# Altium footprint library Supernova Connectors.PcbLib: 303 footprints (part 19 of 19)
Each footprint in its own frame and in the unit in brackets; x right, y up, seen from the top. Pads: shape width x height; smd on the part's side, far side on the other; paste and mask are expansions set on the pad; w line width, h text height; cw(c..) or ccw(c..) is an arc to the next point about the centre after c.
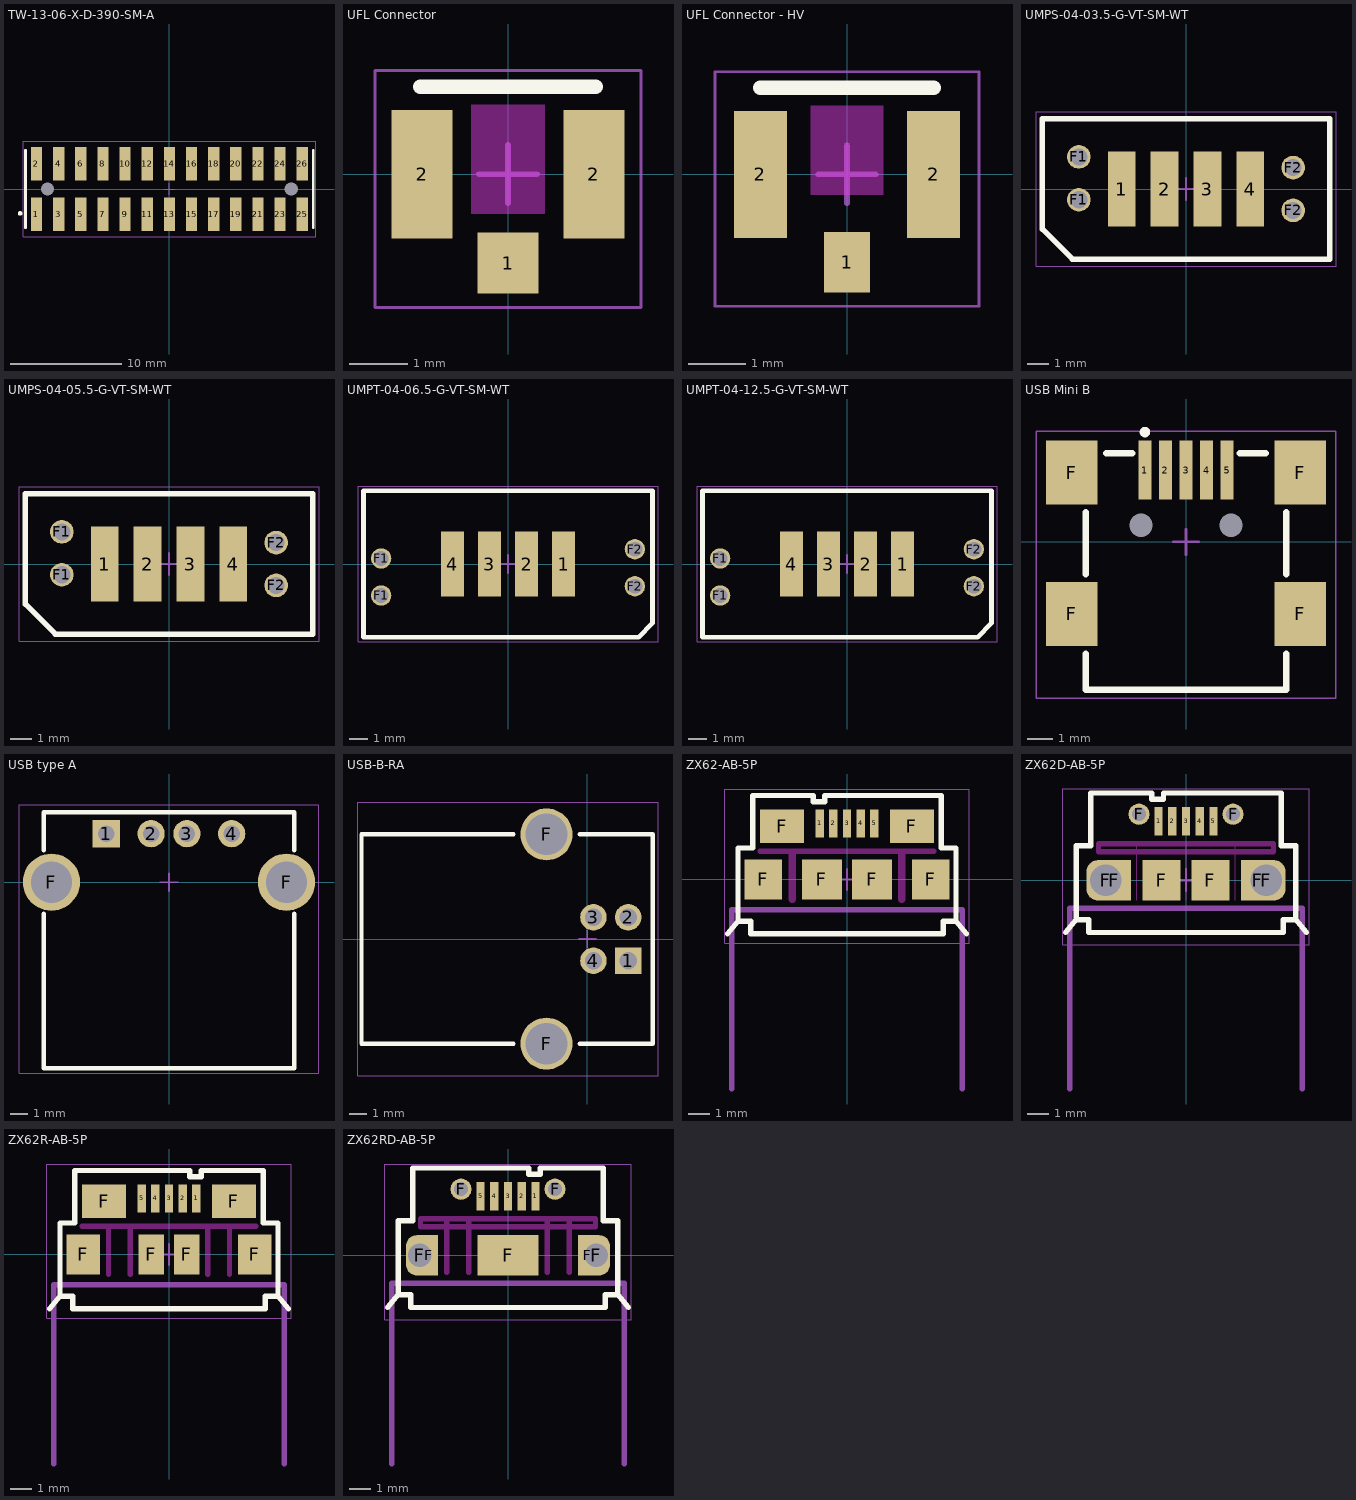
[diagram p18: the footprints below, top view; thin cyan lines are the x and y axes]

## TW-13-06-X-D-390-SM-A [mil]
pads (28):
  rect 40x119 smd mask+2: 1(-472.44,-89.5) 2(-472.44,89.5) 3(-393.7,-89.5) 4(-393.7,89.5) 5(-314.96,-89.5) 6(-314.96,89.5) 7(-236.22,-89.5) 8(-236.22,89.5) 9(-157.48,-89.5) 10(-157.48,89.5) 11(-78.74,-89.5) 12(-78.74,89.5) 13(0,-89.5) 14(0,89.5) 15(78.74,-89.5) 16(78.74,89.5) 17(157.48,-89.5) 18(157.48,89.5) 19(236.22,-89.5) 20(236.22,89.5) 21(314.96,-89.5) 22(314.96,89.5) 23(393.7,-89.5) 24(393.7,89.5) 25(472.44,-89.5) 26(472.44,89.5)
  round 0 hole 46.85 unplated: ""(-433.07,0) ""(433.07,0)
Top Overlay:
  circle w8: c-530.63,-86.61 r4
  lines w10: -511.81,-137.8 -511.81,137.8 ; 511.81,-137.8 511.81,137.8
Top Courtyard:
  lines w1.97: -520,-170 -520,170 520,170 520,-170 -520,-170
  lines w3.94: -19.68,0 19.68,0 ; 0,-19.68 0,19.69
3D body "TW-13-06-L-D-390-SM-A.stp": height 605, standoff -50, extent -511.8,-132.49 511.82,132.51

## UFL Connector [mm]
pads (3):
  rect 1.05x1.05 smd: 1(0,-1.525)
  rect 1.05x2.2 smd paste-0.1: 2(-1.475,0) 2(1.475,0)
Top Layer keep-out:
  rectangle: -0.635,-0.686 0.635,1.194
Top Overlay:
  lines w0.254: -1.5,1.5 1.5,1.5
Top Courtyard:
  lines w0.05: -2.286,-2.286 2.286,-2.286 2.286,1.778 -2.286,1.778 -2.286,-2.286
  lines w0.1: -0.5,0 0.5,0 ; 0,-0.5 0,0.5
3D body "U.FL-R-SMT.stp": height 1.25, standoff 0, extent -1.5,-1.525 1.5,1.575

## UFL Connector - HV [mm]
pads (3):
  rect 0.8x1.05 smd: 1(0,-1.525)
  rect 0.914x2.2 smd paste-0.1: 2(-1.5,0) 2(1.5,0)
Top Layer keep-out:
  rectangle: -0.635,-0.356 0.635,1.194
Top Overlay:
  lines w0.254: -1.5,1.5 1.5,1.5
Top Courtyard:
  lines w0.05: -2.286,-2.286 -2.286,1.778 2.286,1.778 2.286,-2.286 -2.286,-2.286
  lines w0.1: -0.5,0 0.5,0 ; 0,-0.5 0,0.5
3D body "U.FL-R-SMT.stp": height 1.25, standoff 0, extent -1.5,-1.525 1.5,1.575

## UMPS-04-03.5-G-VT-SM-WT [mm]
pads (8):
  rect 1.3x3.5 smd: 1(-3,0) 2(-1,0) 3(1,0) 4(3,0)
  round 1.1 hole 0.8: F1(-5,-0.5) F1(-5,1.5) F2(5,-1) F2(5,1)
Top Overlay:
  lines w0.254: -6.7,-1.875 -6.7,3.275 6.7,3.275 6.7,-3.275 -5.3,-3.275 -6.7,-1.875
Top Paste:
  region: 6.85,-0.2 4.4,-0.2 4.4,-2.48 6.85,-2.48
  region: 6.85,2.48 4.4,2.48 4.4,0.2 6.85,0.2
  rectangle: -6.85,-1.98 -4.4,0.3
  rectangle: -6.85,0.7 -4.4,2.98
Top Courtyard:
  lines w0.05: -7,-3.6 7,-3.6 7,3.6 -7,3.6 -7,-3.6
  lines w0.1: -0.5,0 0.5,0 ; 0,-0.5 0,0.5
3D body "UMPS-04-03.5-G-VT-SM-WT.stp": height 4.18, standoff -1.42, extent -6.525,-3.1 6.525,3.1

## UMPS-04-05.5-G-VT-SM-WT [mm]
pads (8):
  rect 1.3x3.5 smd: 1(-3,0) 2(-1,0) 3(1,0) 4(3,0)
  round 1.1 hole 0.8: F1(-5,-0.5) F1(-5,1.5) F2(5,-1) F2(5,1)
Top Overlay:
  lines w0.254: -6.7,-1.875 -5.3,-3.275 6.7,-3.275 6.7,3.275 -6.7,3.275 -6.7,-1.875
Top Paste:
  rectangle: -6.85,0.7 -4.4,2.98
  rectangle: -6.85,-1.98 -4.4,0.3
  region: 6.85,2.48 4.4,2.48 4.4,0.2 6.85,0.2
  region: 6.85,-0.2 4.4,-0.2 4.4,-2.48 6.85,-2.48
Top Courtyard:
  lines w0.05: -7,-3.6 -7,3.6 7,3.6 7,-3.6 -7,-3.6
  lines w0.1: -0.5,0 0.5,0 ; 0,-0.5 0,0.5
3D body "UMPS-04-05.5-G-VT-SM-WT.stp": height 6.18, standoff -1.42, extent -6.525,-3.1 6.525,3.1

## UMPT-04-06.5-G-VT-SM-WT [mm]
pads (8):
  rect 1.25x3.5 smd: 1(3,0) 2(1,0) 3(-1,0) 4(-3,0)
  round 1.1 hole 0.8: F1(-6.85,-1.7) F1(-6.85,0.3) F2(6.85,-1.2) F2(6.85,0.8)
Top Overlay:
  lines w0.254: -7.8,-3.95 7.05,-3.95 7.8,-3.2 7.8,3.95 -7.8,3.95 -7.8,-3.95
Top Paste:
  rectangle: -8.075,-3.18 -5.625,-0.9
  rectangle: -8.075,-0.5 -5.625,1.78
  rectangle: 5.625,-2.68 8.075,-0.4
  rectangle: 5.625,0 8.075,2.28
Top Courtyard:
  lines w0.05: -8.1,-4.2 -8.1,4.2 8.1,4.2 8.1,-4.2 -8.1,-4.2
  lines w0.1: -0.5,0 0.5,0 ; 0,-0.5 0,0.5
3D body "UMPT-04-06.5-G-VT-SM-WT.stp": height 9.58, standoff -1.37, extent -7.65,-3.8 7.65,3.8

## UMPT-04-12.5-G-VT-SM-WT [mm]
pads (8):
  rect 1.25x3.5 smd: 1(3,0) 2(1,0) 3(-1,0) 4(-3,0)
  round 1.1 hole 0.8: F1(-6.85,-1.7) F1(-6.85,0.3) F2(6.85,-1.2) F2(6.85,0.8)
Top Overlay:
  lines w0.254: -7.8,-3.95 -7.8,3.95 7.8,3.95 7.8,-3.2 7.05,-3.95 -7.8,-3.95
Top Paste:
  rectangle: 5.625,0 8.075,2.28
  rectangle: 5.625,-2.68 8.075,-0.4
  rectangle: -8.075,-0.5 -5.625,1.78
  rectangle: -8.075,-3.18 -5.625,-0.9
Top Courtyard:
  lines w0.05: -8.1,-4.2 8.1,-4.2 8.1,4.2 -8.1,4.2 -8.1,-4.2
  lines w0.1: -0.5,0 0.5,0 ; 0,-0.5 0,0.5
3D body "UMPT-04-12.5-G-VT-SM-WT.stp": height 15.82, standoff -1.37, extent -7.65,-3.8 7.65,3.8

## USB Mini B [mm]
pads (11):
  rect 0.5x2.3 smd mask+0.051: 1(-1.6,2.8) 2(-0.8,2.8) 3(0,2.8) 4(0.8,2.8) 5(1.6,2.8)
  rect 2x2.5 smd paste-0.15: F(-4.45,-2.8) F(-4.45,2.7) F(4.45,-2.8) F(4.45,2.7)
  round 0.5 hole 0.9 unplated: ""(-1.75,0.65) ""(1.75,0.65)
Top Overlay:
  circle w0.203: c-1.6,4.278 r0.102
  lines w0.254: -3.9,-4.35 -3.9,-5.75 3.9,-5.75 3.9,-4.35 ; -3.9,-1.25 -3.9,1.15 ; -3.1,3.45 -2.1,3.45 ; 2.1,3.45 3.1,3.45 ; 3.9,-1.25 3.9,1.15
Top Courtyard:
  lines w0.05: -5.842,-6.096 5.842,-6.096 5.842,4.318 -5.842,4.318 -5.842,-6.096
  lines w0.1: -0.5,0 0.5,0 ; 0,-0.5 0,0.5
3D body "c-1734035-1-e-3d.STEP": height 4.14, standoff -0.95, extent -4.95,-5.75 4.95,3.45

## USB type A [mm]
pads (6):
  rect 1.524x1.524 hole 0.92: 1(-3.5,2.71)
  round 1.524 hole 0.92: 2(-1,2.71) 3(1,2.71) 4(3.5,2.71)
  round 3.2 hole 2.3: F(-6.57,0) F(6.57,0)
Top Overlay:
  lines w0.254: -7,-1.775 -7,-10.4 7,-10.4 7,-1.775 ; -7,1.775 -7,3.9 7,3.9 7,1.775
Top Courtyard:
  lines w0.05: -8.382,-10.668 -8.382,4.318 8.382,4.318 8.382,-10.668 -8.382,-10.668
  lines w0.1: -0.5,0 0.5,0 ; 0,-0.5 0,0.5
3D body "1001-001-01000.STEP": height 7.65, standoff -3.77, extent -7.849,-10.338 7.848,3.812

## USB-B-RA [mm]
pads (6):
  rect 1.524x1.524 hole 1: 1(2.35,-1.25)
  round 1.524 hole 1: 2(2.35,1.25) 3(0.35,1.25) 4(0.35,-1.25)
  round 3 hole 2.4: F(-2.35,-6.02) F(-2.35,6.02)
Top Overlay:
  lines w0.254: -4.25,-6.02 -13,-6.02 -13,6.02 -4.25,6.02 ; -0.45,-6.02 3.75,-6.02 3.75,6.02 -0.45,6.02
Top Courtyard:
  lines w0.05: -13.2,-7.874 4.064,-7.874 4.064,7.874 -13.2,7.874 -13.2,-7.874
  lines w0.1: -0.5,0 0.5,0 ; 0,-0.5 0,0.5
3D body "lumberg_2411_03.stp": height 10.98, standoff -3.61, extent -12.8,-7.499 3.9,7.499

## V2016B [mm]
3D body "v2016b.stp": height 9, standoff 2, extent -4.25,-4.25 4.25,4.25

## ZX62-AB-5P [mm]
pads (11):
  rect 0.4x1.35 smd: 1(-1.3,2.675) 2(-0.65,2.675) 3(0,2.675) 4(0.65,2.675) 5(1.3,2.675)
  rect 1.8x1.9 smd paste-0.15: F(-4,0) F(4,0)
  rect 2.1x1.6 smd paste-0.15: F(-3.1,2.55) F(3.1,2.55)
  rect 1.9x1.9 smd paste-0.15: F(-1.2,0) F(1.2,0)
Top Layer keep-out:
  lines w0.254: -4.14,1.347 4.14,1.347
  lines w0.356: -2.616,-0.94 -2.616,1.27 ; 2.616,-0.94 2.616,1.27
Top Overlay:
  lines w0.254: -5.7,-2.595 -5.2,-1.995 ; -1.626,4.005 -4.5,4.005 -4.5,1.505 -5.2,1.505 -5.2,-1.295 -5.2,-1.995 ; -1.616,4.005 -1.616,3.705 -1.066,3.705 -1.066,4.005 ; -1.041,4.005 4.5,4.005 4.5,1.505 5.2,1.505 5.2,-1.295 5.2,-1.995 ; 5.7,-2.595 5.2,-1.995 ; -5.2,-1.995 -4.6,-1.995 -4.6,-2.595 4.6,-2.595 4.6,-1.995 5.2,-1.995
Mechanical 5:
  lines w0.254: -5.5,-10 -5.5,-1.45 5.5,-1.45 5.5,-10
Top Courtyard:
  lines w0.05: -5.842,-3.048 5.842,-3.048 5.842,4.318 -5.842,4.318 -5.842,-3.048
  lines w0.1: -0.5,0 0.5,0 ; 0,-0.5 0,0.5
3D body "ZX62-AB-5PA.stp": height 2.76, standoff -0.19, extent -4.4,-2.773 4.4,2.827

## ZX62D-AB-5P [mm]
pads (13):
  rect 0.4x1.35 smd: 1(-1.3,2.8) 2(-0.65,2.8) 3(0,2.8) 4(0.65,2.8) 5(1.3,2.8)
  rrect56% 1.8x1.9 hole 1.5: F(-3.8,0) F(3.8,0)
  rect 1.575x1.9 smd: F(-3.387,0) F(3.387,0)
  round 1 hole 0.66: F(-2.225,3.125) F(2.225,3.125)
  rect 1.8x1.9 smd paste-0.15: F(-1.15,0) F(1.15,0)
Top Layer keep-out:
  lines w0.051: -2.325,-0.95 -2.325,1.722 ; 0,-0.95 0,1.722 ; 2.325,-0.95 2.325,1.722
  lines w0.254: -4.14,1.35 -4.14,1.722 4.14,1.722 4.14,1.35 -4.14,1.35
Top Overlay:
  lines w0.254: -5.7,-2.47 -5.2,-1.87 ; -1.626,4.13 -4.5,4.13 -4.5,1.63 -5.2,1.63 -5.2,-1.17 -5.2,-1.87 ; -1.616,4.13 -1.616,3.83 -1.066,3.83 -1.066,4.13 ; -1.041,4.13 4.5,4.13 4.5,1.63 5.2,1.63 5.2,-1.17 5.2,-1.87 ; 5.7,-2.47 5.2,-1.87 ; -5.2,-1.87 -4.6,-1.87 -4.6,-2.47 4.6,-2.47 4.6,-1.87 5.2,-1.87
Mechanical 5:
  lines w0.254: -5.5,-9.875 -5.5,-1.325 5.5,-1.325 5.5,-9.875
Top Courtyard:
  lines w0.05: -5.842,-3.048 -5.842,4.318 5.842,4.318 5.842,-3.048 -5.842,-3.048
  lines w0.1: -0.5,0 0.5,0 ; 0,-0.5 0,0.5
3D body "ZX62D-AB-5P8.stp": height 2.79, standoff -0.6, extent -4.325,-2.624 4.325,3.274

## ZX62R-AB-5P [mm]
pads (11):
  rect 0.4x1.35 smd: 1(1.3,2.675) 2(0.65,2.675) 3(0,2.675) 4(-0.65,2.675) 5(-1.3,2.675)
  rect 1.6x1.9 smd paste-0.15: F(-4.1,0) F(4.1,0)
  rect 2.1x1.6 smd paste-0.15: F(-3.1,2.55) F(3.1,2.55)
  rect 1.2x1.9 smd paste-0.15: F(-0.85,0) F(0.85,0)
Top Layer keep-out:
  lines w0.254: -4.14,1.347 4.14,1.347 ; -2.891,-0.94 -2.891,1.347 ; -1.85,-0.94 -1.85,1.347 ; 1.85,-0.94 1.85,1.347 ; 2.891,-0.94 2.891,1.347
Top Overlay:
  lines w0.254: -5.7,-2.595 -5.2,-1.995 ; 5.7,-2.595 5.2,-1.995 ; -5.2,-1.995 -5.2,-1.295 -5.2,1.505 -4.5,1.505 -4.5,4.005 0.984,4.005 0.984,3.705 1.534,3.705 1.534,4.005 4.5,4.005 4.5,1.505 5.2,1.505 5.2,-1.295 5.2,-1.995 ; -5.2,-1.995 -4.6,-1.995 -4.6,-2.595 4.6,-2.595 4.6,-1.995 5.2,-1.995
Top 3D Body:
  lines w0.254: -5.5,-10 -5.5,-1.45 5.5,-1.45 5.5,-10
Top Courtyard:
  lines w0.05: -5.842,-3.048 -5.842,4.318 5.842,4.318 5.842,-3.048 -5.842,-3.048
  lines w0.1: -0.5,0 0.5,0 ; 0,-0.5 0,0.5
3D body "ZX62R-AB-5P.stp": height 2.78, standoff -0.2, extent -4.4,-2.76 4.4,2.84

## ZX62RD-AB-5P [mm]
pads (12):
  rect 0.4x1.35 smd: 1(1.3,2.8) 2(0.65,2.8) 3(0,2.8) 4(-0.65,2.8) 5(-1.3,2.8)
  rrect77% 1.3x1.9 hole 1.1: F(-4.175,0) F(4.175,0)
  rect 0.875x1.9 smd: F(-3.738,0) F(3.738,0)
  round 1 hole 0.66: F(-2.225,3.125) F(2.225,3.125)
  rect 2.9x1.9 smd paste-0.15: F(0,0)
Top Layer keep-out:
  lines w0.254: -2.9,-0.815 -2.9,1.725 ; -1.85,-0.811 -1.85,1.725 ; 1.85,-0.811 1.85,1.725 ; 2.9,-0.815 2.9,1.725 ; -4.14,1.35 -4.14,1.725 4.14,1.725 4.14,1.35 -4.14,1.35
Top Overlay:
  lines w0.254: -5.7,-2.47 -5.2,-1.87 ; 5.7,-2.47 5.2,-1.87 ; -5.2,-1.87 -5.2,-1.17 -5.2,1.63 -4.5,1.63 -4.5,4.13 0.984,4.13 0.984,3.83 1.534,3.83 1.534,4.13 4.5,4.13 4.5,1.63 5.2,1.63 5.2,-1.17 5.2,-1.87 ; -5.2,-1.87 -4.6,-1.87 -4.6,-2.47 4.6,-2.47 4.6,-1.87 5.2,-1.87
Mechanical 5:
  lines w0.254: -5.5,-9.875 -5.5,-1.325 5.5,-1.325 5.5,-9.875
Top Courtyard:
  lines w0.05: -5.842,-3.048 -5.842,4.318 5.842,4.318 5.842,-3.048 -5.842,-3.048
  lines w0.1: -0.5,0 0.5,0 ; 0,-0.5 0,0.5
3D body "ZX62RD-AB-5P8.stp": height 2.78, standoff -0.6, extent -4.325,-2.625 4.325,3.274